# Altium footprint library SMT.PcbLib: 379 footprints (part 15 of 24)
Each footprint in its own frame and in the unit in brackets; x right, y up, seen from the top. Pads: shape width x height; smd on the part's side, far side on the other; paste and mask are expansions set on the pad; w line width, h text height; cw(c..) or ccw(c..) is an arc to the next point about the centre after c.
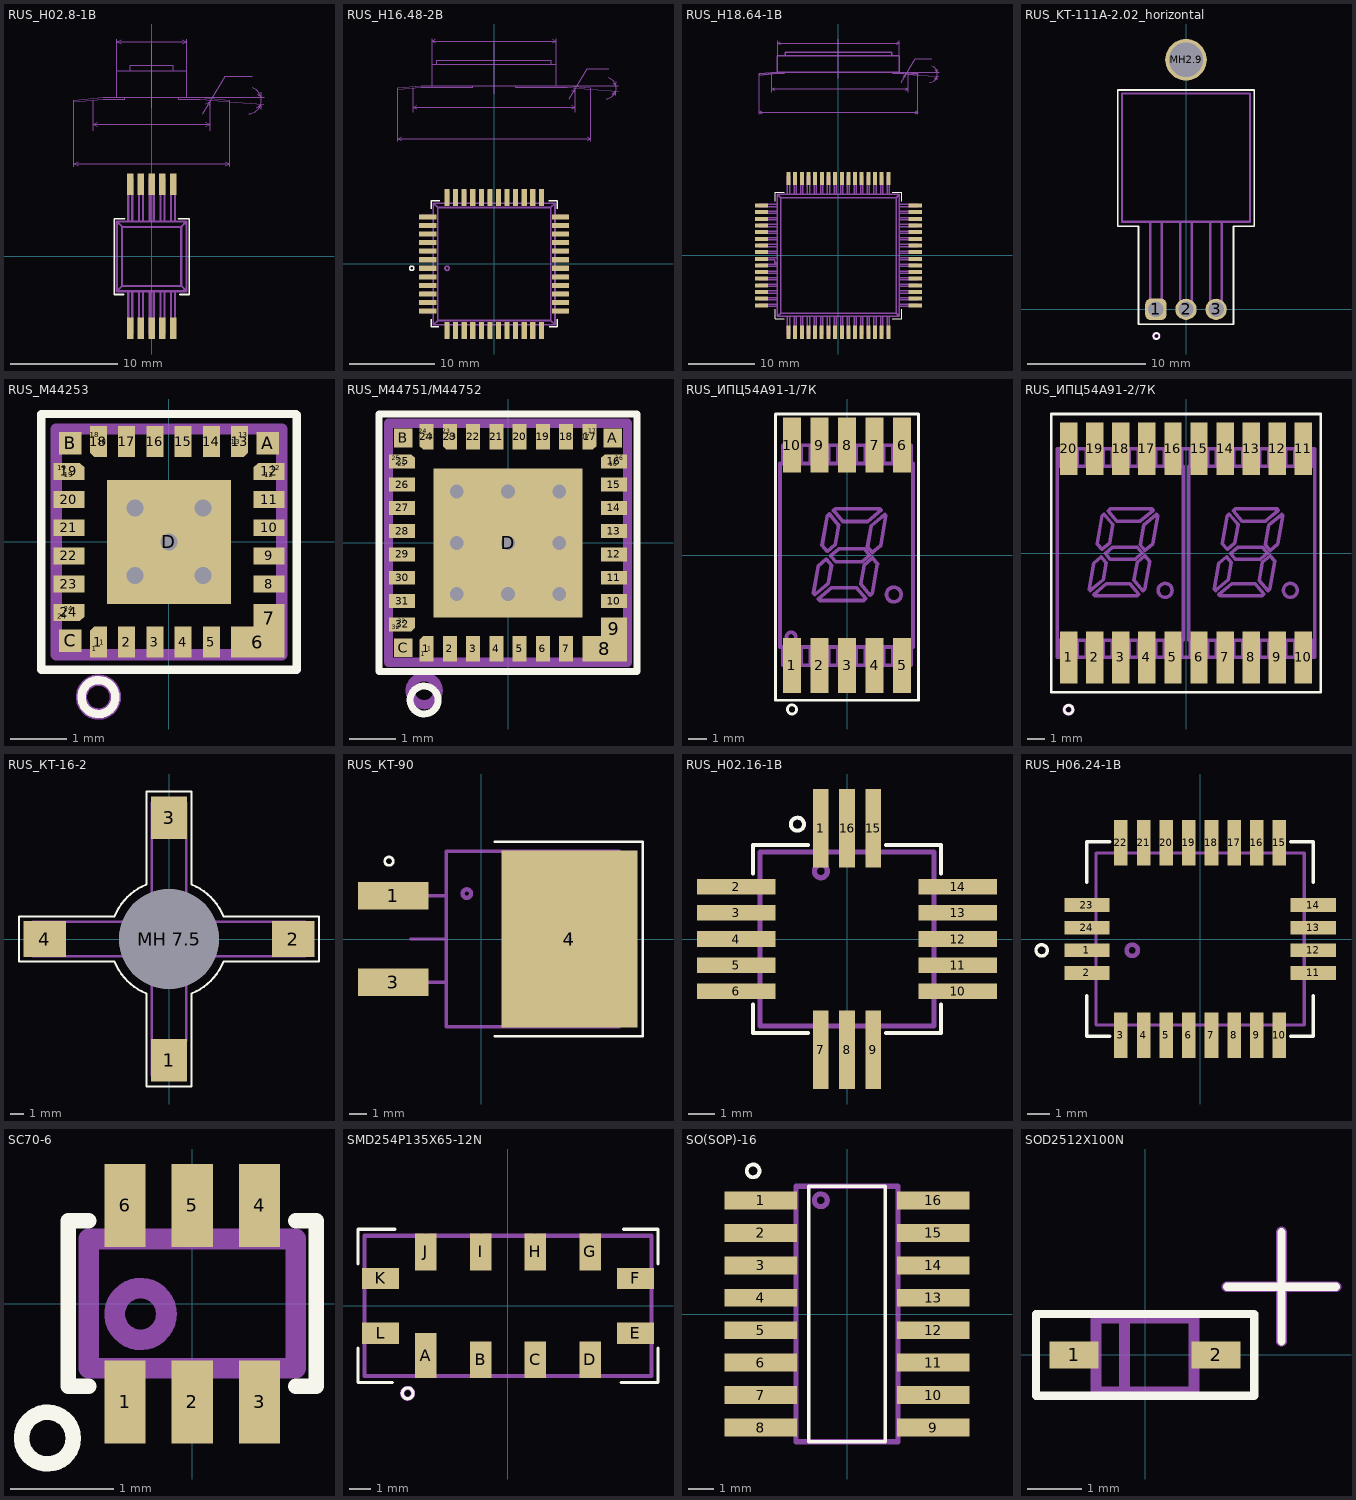
[diagram p14: the footprints below, top view; thin cyan lines are the x and y axes]

## RUS_H02.8-1B [mm] "Установка показана на слое Mech20"
height 2.9
pads (10):
  rect 0.6x2 smd: 1(-2,-6.7) 2(-1,-6.7) 3(1,-6.7) 4(2,-6.7) 5(2,6.7) 6(1,6.7) 7(-1,6.7) 8(-2,6.7) MH(0,-6.7) MH(0,6.7)
Top Overlay:
  lines w0.15: -2.6,-3.55 -3.5,-3.55 -3.5,3.5 -2.5,3.5 ; 2.5,3.5 3.5,3.5 3.5,-3.55 2.6,-3.55
Mechanical 1:
  lines w0.2: -2.185,-3.25 -2.185,-7.25 -1.815,-7.25 -1.815,-3.25 ; -2.185,3.25 -2.185,7.25 -1.815,7.25 -1.815,3.25 ; -1.185,-3.25 -1.185,-7.25 -0.815,-7.25 -0.815,-3.25 ; -1.185,3.25 -1.185,7.25 -0.815,7.25 -0.815,3.25 ; -0.185,-3.25 -0.185,-7.25 0.185,-7.25 0.185,-3.25 ; -0.185,3.25 -0.185,7.25 0.185,7.25 0.185,3.25 ; 0.815,-3.25 0.815,-7.25 1.185,-7.25 1.185,-3.25 ; 0.815,3.25 0.815,7.25 1.185,7.25 1.185,3.25 ; 1.815,-3.25 1.815,-7.25 2.185,-7.25 2.185,-3.25 ; 1.815,3.25 1.815,7.25 2.185,7.25 2.185,3.25 ; -3.25,-3.25 3.25,-3.25 ; -3.25,-3.25 -3.25,3.25 ; -3.25,-3.25 -2.75,-2.75 ; -3.25,3.25 -2.75,2.75 ; -3.25,3.25 3.25,3.25 ; -2.75,-2.75 -2.75,2.75 ; -2.75,-2.75 2.75,-2.75 ; -2.75,2.75 2.75,2.75 ; 2.75,-2.75 2.75,2.75 ; 2.75,-2.75 3.25,-3.25 ; 2.75,2.75 3.25,3.25 ; 3.25,-3.25 3.25,3.25
Mechanical 20:
  lines w0.1: -7.25,8.329 -7.25,14.389 ; -6.85,8.429 -7.25,8.629 ; -6.85,8.829 -7.25,8.629 ; -5.45,11.717 -5.45,14.546 ; -5.05,12.1 -5.45,12.3 ; -5.05,12.5 -5.45,12.3 ; -3.25,20.25 -3.25,17.3 ; -2.85,19.8 -3.25,20 ; -2.85,20.2 -3.25,20 ; -2.501,14.8 -2.501,14.629 -4.501,14.629 -7.25,14.389 ; 0,13.85 0,19.8 ; 2.501,14.8 2.501,14.629 4.501,14.629 7.25,14.389 ; 2.85,19.8 3.25,20 2.85,20.2 ; 3.2,20 -3.25,20 ; 3.25,20.25 3.25,17.3 ; 4.75,13.3 6.85,16.8 9.35,16.8 ; 5.05,12.1 5.45,12.3 ; 5.05,12.5 5.45,12.3 ; 5.05,14.2 5.45,14.467 5.4,14.025 ; 5.45,11.717 5.45,14.546 ; 6.85,8.429 7.25,8.629 ; 6.85,8.829 7.25,8.629 ; 7.25,8.329 7.25,14.389 ; 9.056,13.278 ccw(c8.975,14.525) 9.395,15.702 ; 9.8,13.825 10.2,14.192 10.2,13.7 ; 9.825,15.1 10.2,14.85 10.225,15.275 ; 10.45,14.175 7.25,14.389 ; 10.475,14.8 4.5,14.8 ; -7.25,8.629 7.25,8.629 ; -7.25,14.389 -7.25,14.559 -4.5,14.8 -3.25,14.8 ; -5.45,12.3 5.45,12.3 ; -3.25,14.8 3.25,14.8 ; -3.25,14.8 -3.25,17.3 ; -3.25,17.3 3.25,17.3 ; 3.25,14.8 3.25,17.3 ; 3.25,14.8 4.5,14.8 ; 4.5,14.8 7.25,14.559 7.25,14.389 ; -2,17.3 2,17.3 2,17.8 -2,17.8 -2,17.3
  text "6.5*" at -0.85,20.55 h1.2
  text "4-10" at 10.725,14.225 h1.2
  text "R0.3+0.1" at 6.325,17.375 h1.2
  text "14.5+-0.2" at -2.15,9.05 h1.2
  text "11,6+-0.1" at -2.3,12.8 h1.2
3D body "Н02.8-1В.stp": height 2.91, standoff 0.01, extent -3.25,-7.25 3.25,7.25

## RUS_H16.48-2B [mm] "Установка по РД 107.46000.019"
height 3
pads (48):
  rect 2x0.6 smd mask+0.05: 1(-7.75,-0.5) 2(-7.75,-1.5) 3(-7.75,-2.5) 4(-7.75,-3.5) 5(-7.75,-4.5) 6(-7.75,-5.5) 19(7.75,-5.5) 20(7.75,-4.5) 21(7.75,-3.5) 22(7.75,-2.5) 23(7.75,-1.5) 24(7.75,-0.5) 25(7.75,0.5) 26(7.75,1.5) 27(7.75,2.5) 28(7.75,3.5) 29(7.75,4.5) 30(7.75,5.5) 43(-7.75,5.5) 44(-7.75,4.5) 45(-7.75,3.5) 46(-7.75,2.5) 47(-7.75,1.5) 48(-7.75,0.5)
  rect 0.6x2 smd mask+0.05: 7(-5.5,-7.75) 8(-4.5,-7.75) 9(-3.5,-7.75) 10(-2.5,-7.75) 11(-1.5,-7.75) 12(-0.5,-7.75) 13(0.5,-7.75) 14(1.5,-7.75) 15(2.5,-7.75) 16(3.5,-7.75) 17(4.5,-7.75) 18(5.5,-7.75) 31(5.5,7.75) 32(4.5,7.75) 33(3.5,7.75) 34(2.5,7.75) 35(1.5,7.75) 36(0.5,7.75) 37(-0.5,7.75) 38(-1.5,7.75) 39(-2.5,7.75) 40(-3.5,7.75) 41(-4.5,7.75) 42(-5.5,7.75)
Top Overlay:
  circle w0.15: c-9.625,-0.5 r0.25
  lines w0.15: -7.35,-6.45 -7.35,-7.35 -6.45,-7.35 ; -7.35,6.45 -7.35,7.35 -6.35,7.35 ; 6.35,7.35 7.35,7.35 7.35,6.45 ; 6.45,-7.35 7.35,-7.35 7.35,-6.45
Mechanical 1:
  drawing of 161 lines, arcs and shapes, not listed
Mechanical 20:
  lines w0.1: -11.25,14.329 -11.25,20.389 ; -10.85,14.429 -11.25,14.629 ; -10.85,14.829 -11.25,14.629 ; -9.45,17.717 -9.45,20.546 ; -9.05,18.1 -9.45,18.3 ; -9.05,18.5 -9.45,18.3 ; -7.25,26.25 -7.25,23.3 ; -6.85,25.8 -7.25,26 ; -6.85,26.2 -7.25,26 ; -2.501,20.8 -2.501,20.629 -8.501,20.629 -11.25,20.389 ; -0.75,23.3 -7.25,23.3 ; 0,19.85 0,25.8 ; 0.75,23.3 7.25,23.3 ; 2.501,20.8 2.501,20.629 8.501,20.629 11.25,20.389 ; 6.85,25.8 7.25,26 ; 6.85,26.2 7.25,26 ; 7.25,26.25 7.25,23.3 ; 8.75,19.3 10.85,22.8 13.35,22.8 ; 9.05,18.1 9.45,18.3 ; 9.05,18.5 9.45,18.3 ; 9.05,20.2 9.45,20.467 9.4,20.025 ; 9.45,17.717 9.45,20.546 ; 10.85,14.429 11.25,14.629 ; 10.85,14.829 11.25,14.629 ; 11.25,14.329 11.25,20.389 ; 13.056,19.278 ccw(c12.975,20.525) 13.395,21.702 ; 13.8,19.825 14.2,20.192 14.2,19.7 ; 13.825,21.1 14.2,20.85 14.225,21.275 ; 14.45,20.175 11.25,20.389 ; 14.475,20.8 8.5,20.8 ; -11.25,14.629 11.25,14.629 ; -11.25,20.389 -11.25,20.559 -8.5,20.8 -7.25,20.8 ; -9.45,18.3 9.45,18.3 ; -7.25,20.8 -7.25,23.3 ; -7.25,20.8 7.25,20.8 ; -7.25,26 7.25,26 ; 7.25,20.8 8.5,20.8 ; 7.25,20.8 7.25,23.3 ; 8.5,20.8 11.25,20.559 11.25,20.389 ; -6.675,23.3 -6.675,23.8 6.675,23.8 6.675,23.3 -6.675,23.3
  text "16.2 max" at -2.3,18.8 h1.2
  text "22.5max" at -2.15,15.05 h1.2
  text "R0.3+0.1" at 10.325,23.375 h1.2
  text "4-10" at 14.725,20.225 h1.2
  text "14.2+0.3-0.215*" at -3.025,26.6 h1.2
  text "Установка по РД 107.46000.019" at -8.5,28.093 h1.5
3D body "H16_48-2B.stp": height 2.8, standoff 0, extent -8.5,-8.5 8.5,8.5

## RUS_H18.64-1B [mm] "Вариант установки на слое Mech20"
height 3
pads (64):
  rect 2x0.6 smd: 1(-11.55,-0.5) 2(-11.55,-1.5) 3(-11.55,-2.5) 4(-11.55,-3.5) 5(-11.55,-4.5) 6(-11.55,-5.5) 7(-11.55,-6.5) 8(-11.55,-7.5) 25(11.55,-7.5) 26(11.55,-6.5) 27(11.55,-5.5) 28(11.55,-4.5) 29(11.55,-3.5) 30(11.55,-2.5) 31(11.55,-1.5) 32(11.55,-0.5) 33(11.55,0.5) 34(11.55,1.5) 35(11.55,2.5) 36(11.55,3.5) 37(11.55,4.5) 38(11.55,5.5) 39(11.55,6.5) 40(11.55,7.5) 57(-11.55,7.5) 58(-11.55,6.5) 59(-11.55,5.5) 60(-11.55,4.5) 61(-11.55,3.5) 62(-11.55,2.5) 63(-11.55,1.5) 64(-11.55,0.5)
  rect 0.6x2 smd: 9(-7.5,-11.55) 10(-6.5,-11.55) 11(-5.5,-11.55) 12(-4.5,-11.55) 13(-3.5,-11.55) 14(-2.51,-11.55) 15(-1.5,-11.55) 16(-0.5,-11.55) 17(0.5,-11.55) 18(1.5,-11.55) 19(2.5,-11.55) 20(3.5,-11.55) 21(4.5,-11.55) 22(5.5,-11.55) 23(6.5,-11.55) 24(7.5,-11.55) 41(7.5,11.55) 42(6.5,11.55) 43(5.5,11.55) 44(4.5,11.55) 45(3.5,11.55) 46(2.5,11.55) 47(1.5,11.55) 48(0.5,11.55) 49(-0.5,11.55) 50(-1.5,11.55) 51(-2.5,11.55) 52(-3.5,11.55) 53(-4.5,11.55) 54(-5.5,11.55) 55(-6.5,11.55) 56(-7.5,11.55)
Top Overlay:
  lines w0.15: -9.5,-8.1 -9.5,-9.5 -8.1,-9.5 ; -9.5,8.1 -9.5,9.5 -8.1,9.5 ; 8.1,-9.5 9.5,-9.5 9.5,-8.1 ; 8.1,9.5 9.5,9.5 9.5,8.1
Mechanical 1:
  drawing of 206 lines, arcs and shapes, not listed
Mechanical 20:
  lines w0.1: -11.9,21.2 -11.9,27.259 ; -11.5,21.3 -11.9,21.5 ; -11.5,21.7 -11.9,21.5 ; -10,24.5 -10,27.329 ; -9.6,24.8 -10,25 ; -9.6,25.2 -10,25 ; -9.151,32.2 -9.15,30 ; -8.75,31.675 -9.15,31.875 ; -8.75,32.075 -9.15,31.875 ; 0,26.6 0,32.5 ; 8.725,31.675 9.125,31.875 ; 8.725,32.075 9.125,31.875 ; 9.15,27.5 15.125,27.5 ; 9.15,30 9.151,32.2 ; 9.4,26 11.5,29.5 14,29.5 ; 9.7,26.9 10.1,27.167 10.05,26.725 ; 10.1,24.8 10.5,25 ; 10.1,25.2 10.5,25 ; 10.5,24.5 10.5,27.211 ; 11.5,21.3 11.9,21.5 ; 11.5,21.7 11.9,21.5 ; 11.9,21.2 11.9,27.259 ; 11.9,27.089 15.1,26.875 ; 13.706,25.978 ccw(c13.625,27.225) 14.045,28.402 ; 14.45,26.525 14.85,26.892 14.85,26.4 ; 14.475,27.8 14.85,27.55 14.875,27.975 ; -11.9,21.5 11.9,21.5 ; -10,25 10.5,25 ; -9.15,31.875 9.125,31.875
  lines w0.2: -8.151,27.5 -8.151,27.329 -9.151,27.329 -11.9,27.089 -11.9,27.259 -9.15,27.5 ; 8.151,27.5 8.151,27.329 9.151,27.329 11.9,27.089 11.9,27.259 9.15,27.5 ; -9.15,27.5 9.15,27.5 ; -9.15,27.5 -9.15,30 9.15,30 9.15,27.5 ; -8,30 8,30 8,30.5 -8,30.5 -8,30
  text "4-10" at 15.375,26.925 h1.2
  text "R0.3+0.1" at 10.975,30.075 h1.2
  text "23.8+-0.2" at -2.3,21.8 h1.2
  text "21,9+-0.1" at -2.3,25.5 h1.2
  text "18.3*" at -1.25,32.8 h1.2
3D body "Н18.64-1В.stp": height 3.01, standoff 0.01, extent -11.9,-11.9 11.9,11.9

## RUS_KT-111A-2.02_horizontal [mm] "Установка по   ГОСТ 29137-91  вар.251.10.0402.40.00"
height 5.84
pads (4):
  rrect50% 1.8x1.8 hole 1.3 mask+0.05: 1(-2.54,0)
  round 1.8 hole 1.3 mask+0.05: 2(0,0) 3(2.54,0)
  round 3.5 hole 2.9 mask+0.05: MH2.9(0,21.05)
Top Overlay:
  circle w0.15: c-2.5,-2.25 r0.25
  lines w0.15: -5.75,7 -5.75,18.5 5.75,18.5 5.75,7 4,7 4,-1.25 -4,-1.25 -4,7 -5.75,7
Top Solder:
  rectangle: -5.35,7.4 5.4,18.15
Mechanical 1:
  circle w0.2: c-2.5,-2.25 r0.25
  lines w0.2: -3.025,7.4 -3.025,2 -3.025,-0.25 -2.055,-0.25 -2.055,2 -2.055,7.4 ; -0.485,7.4 -0.485,2 -0.485,-0.25 0.485,-0.25 0.485,2 0.485,7.4 ; 2.055,7.4 2.055,2 2.055,-0.25 3.025,-0.25 3.025,2 3.025,7.4 ; -5.4,7.4 -5.4,18.2 5.4,18.2 5.4,7.4 -5.4,7.4
Mechanical 20:
  text "Установка на теплоотвод и КПТ-8, / фоксировать прижимом ПБВК.745441.002 / Допускается крепить теплопроводящим клеем вместо прижима" at -8.2,22.95 h1.52
3D body "КТ-111А-2.02 ГОРИЗОНТАЛЬНО.stp": height 5.84, standoff -5.1, extent -5.4,-0.25 5.4,18.2

## RUS_M44253 [mm] "Модуль СВЧ переключатель 4х4mm"
height 1.26
pads (40):
  rect 0.17x0.31 smd paste+0 mask+0.04: 1(-1.315,-1.895) 13(1.315,1.895) 18(-1.315,1.895)
  oct 0.3x0.55 smd paste+0 mask+0.04: 1(-1.25,-1.775) 13(1.25,1.775) 18(-1.25,1.775)
  rect 0.17x0.55 smd paste+0 mask+0.04: 1(-1.185,-1.775) 13(1.185,1.775) 18(-1.185,1.775)
  rect 0.3x0.55 smd paste+0 mask+0.04: 2(-0.75,-1.775) 3(-0.25,-1.775) 4(0.25,-1.775) 5(0.75,-1.775) 14(0.75,1.775) 15(0.25,1.775) 16(-0.25,1.775) 17(-0.75,1.775)
  rect 0.95x0.55 smd paste+0 mask+0.04: 6(1.575,-1.775)
  rect 0.55x0.5 smd paste+0 mask+0.04: 7(1.775,-1.35)
  rect 0.55x0.3 smd paste+0 mask+0.04: 8(1.775,-0.75) 9(1.775,-0.25) 10(1.775,0.25) 11(1.775,0.75) 20(-1.775,0.75) 21(-1.775,0.25) 22(-1.775,-0.25) 23(-1.775,-0.75)
  oct 0.55x0.3 smd paste+0 mask+0.04: 12(1.775,1.25) 19(-1.775,1.25) 24(-1.775,-1.25)
  rect 0.55x0.17 smd paste+0 mask+0.04: 12(1.775,1.185) 19(-1.775,1.185) 24(-1.775,-1.185)
  rect 0.31x0.17 smd paste+0 mask+0.04: 12(1.895,1.315) 19(-1.895,1.315) 24(-1.895,-1.315)
  rect 0.4x0.4 smd paste+0 mask+0.04: A(1.75,1.75) B(-1.75,1.75) C(-1.75,-1.75)
  rect 2.2x2.2 all layers, no hole paste-5 mask+0.05: D(0,0)
via 0.6,-0.6 diameter 0.7 hole 0.3
via -0.6,-0.6 diameter 0.7 hole 0.3
via 0.6,0.6 diameter 0.7 hole 0.3
via -0.6,0.6 diameter 0.7 hole 0.3
via 0,0 diameter 0.7 hole 0.3
Top Overlay:
  circle w0.15: c-1.25,-2.75 r0.3
  lines w0.15: -2.265,2.25 -2.265,-2.265 2.25,-2.265 ; -2.265,2.265 2.25,2.265 ; 2.265,-2.265 2.265,2.25
Top Paste:
  region: -1,-1 -0.1,-1 -0.1,-0.1 -1,-0.1
  region: 1,-1 0.1,-1 0.1,-0.1 1,-0.1
  region: 1,1 0.1,1 0.1,0.1 1,0.1
  region: -1,1 -0.1,1 -0.1,0.1 -1,0.1
Mechanical 1:
  circle w0.2: c-1.25,-2.75 r0.3
  lines w0.2: -2,-2 -2,2 2,2 2,-2 -0.615,-2 -2,-2
3D body "Переключатель_ М44253.stp": height 1.26, standoff -0.01, extent -2,-2 2,2

## RUS_M44751/М44752 [mm] "Модуль СВЧ Аттенюатор"
height 1.26
pads (50):
  rect 0.17x0.31 smd paste+0 mask+0.04: 1(-1.815,-2.395) 17(1.815,2.395) 23(-1.315,2.395) 24(-1.815,2.395)
  oct 0.3x0.55 smd paste+0 mask+0.04: 1(-1.75,-2.275) 17(1.75,2.275) 23(-1.25,2.275) 24(-1.75,2.275)
  rect 0.17x0.55 smd paste+0 mask+0.04: 1(-1.685,-2.275) 17(1.685,2.275) 23(-1.185,2.275) 24(-1.685,2.275)
  rect 0.3x0.55 smd paste+0 mask+0.04: 2(-1.25,-2.275) 3(-0.75,-2.275) 4(-0.25,-2.275) 5(0.25,-2.275) 6(0.75,-2.275) 7(1.25,-2.275) 18(1.25,2.275) 19(0.75,2.275) 20(0.25,2.275) 21(-0.25,2.275) 22(-0.75,2.275)
  rect 0.95x0.55 smd paste+0 mask+0.04: 8(2.075,-2.275)
  rect 0.55x0.5 smd paste+0 mask+0.04: 9(2.275,-1.85)
  rect 0.55x0.3 smd paste+0 mask+0.04: 10(2.275,-1.25) 11(2.275,-0.75) 12(2.275,-0.25) 13(2.275,0.25) 14(2.275,0.75) 15(2.275,1.25) 26(-2.275,1.25) 27(-2.275,0.75) 28(-2.275,0.25) 29(-2.275,-0.25) 30(-2.275,-0.75) 31(-2.275,-1.25)
  oct 0.55x0.3 smd paste+0 mask+0.04: 16(2.275,1.75) 25(-2.275,1.75) 32(-2.275,-1.75)
  rect 0.55x0.17 smd paste+0 mask+0.04: 16(2.275,1.685) 25(-2.275,1.685) 32(-2.275,-1.685)
  rect 0.31x0.17 smd paste+0 mask+0.04: 16(2.395,1.815) 25(-2.395,1.815) 32(-2.395,-1.815)
  rect 0.4x0.4 smd paste+0 mask+0.04: A(2.25,2.25) B(-2.25,2.25) C(-2.25,-2.25)
  rect 3.2x3.2 all layers, no hole paste-5 mask+0.05: D(0,0)
via -1.1,-1.1 diameter 0.7 hole 0.3
via 0,-1.1 diameter 0.7 hole 0.3
via 1.1,-1.1 diameter 0.7 hole 0.3
via -1.1,0 diameter 0.7 hole 0.3
via 0,0 diameter 0.7 hole 0.3
via 1.1,0 diameter 0.7 hole 0.3
via -1.1,1.1 diameter 0.7 hole 0.3
via 0,1.1 diameter 0.7 hole 0.3
via 1.1,1.1 diameter 0.7 hole 0.3
Top Overlay:
  circle w0.15: c-1.8,-3.375 r0.3
  lines w0.15: -2.765,-2.765 -2.765,2.765 2.765,2.765 2.765,-2.765 -2.765,-2.765
Top Paste:
  region: -1.5,1.5 -0.15,1.5 -0.15,0.15 -1.5,0.15
  region: 1.5,-1.5 0.15,-1.5 0.15,-0.15 1.5,-0.15
  region: -1.5,-1.5 -0.15,-1.5 -0.15,-0.15 -1.5,-0.15
  region: 1.5,1.5 0.15,1.5 0.15,0.15 1.5,0.15
Mechanical 1:
  circle w0.2: c-1.8,-3.175 r0.3
  lines w0.2: -2.565,-2.565 2.565,-2.565 2.565,2.565 -2.565,2.565 -2.565,-2.565
3D body "Аттенюатор _ М44751.stp": height 1.26, standoff -0.01, extent -2.5,-2.5 2.5,2.5

## RUS_ИПЦ54А91-1/7К [mm] "SMD 7-segment display pitch 1.5 mm"
height 3.75
pads (10):
  rect 1x3 smd paste-0.1 mask+0.05: 1(-3,-6) 2(-1.5,-6) 3(0,-6) 4(1.5,-6) 5(3,-6) 6(3,6) 7(1.5,6) 8(0,6) 9(-1.5,6) 10(-3,6)
Top Overlay:
  circle w0.15: c-3,-8.4 r0.25
  lines w0.15: -3.9,-7.9 -3.9,7.7 3.9,7.7 3.9,-7.9 -3.9,-7.9
Mechanical 1:
  circle w0.2: c-3.048,-4.445 r0.25
  circle w0.2: c2.55,-2.14 r0.4
  lines w0.2: -3.5,-5 -3.5,-6 -3.3,-6 cw(c-3,-6) -2.7,-6 -2.5,-6 ; -3.5,5 -3.5,6 -3.3,6 ccw(c-3,6) -2.7,6 -2.5,6 ; -2.5,-5 -2.5,-6 ; -2.5,5 -2.5,6 ; -2,-5 -2,-6 ; -2,5 -2,6 ; -1,-5 -1,-6 ; -1,5 -1,6 ; -0.5,-5 -0.5,-6 ; -0.5,5 -0.5,6 ; 0.5,-5 0.5,-6 ; 0.5,5 0.5,6 ; 1,-5 1,-6 ; 1,5 1,6 ; 2,-5 2,-6 ; 2,5 2,6 ; 2.5,-5 2.5,-6 ; 2.5,5 2.5,6 ; 3.5,-5 3.5,-6 3.3,-6 ccw(c3,-6) 2.7,-6 2.5,-6 ; 3.5,5 3.5,6 3.3,6 cw(c3,6) 2.7,6 2.5,6 ; -2.5,-6 -2,-6 ; -2.5,6 -2,6 ; -2,-6 -1.8,-6 cw(c-1.5,-6) -1.2,-6 -1,-6 ; -2,6 -1.8,6 ccw(c-1.5,6) -1.2,6 -1,6 ; -1,-6 -0.5,-6 ; -1,6 -0.5,6 ; -0.5,-6 -0.3,-6 cw(c0,-6) 0.3,-6 0.5,-6 ; -0.5,6 -0.3,6 ccw(c0,6) 0.3,6 0.5,6 ; 0.5,-6 1,-6 ; 0.5,6 1,6 ; 1,-6 1.2,-6 cw(c1.5,-6) 1.8,-6 2,-6 ; 1,6 1.2,6 ccw(c1.5,6) 1.8,6 2,6 ; 2,-6 2.5,-6 ; 2,6 2.5,6 ; -3.65,-5 3.6,-5 3.6,5 -3.65,5 -3.65,-5 ; -1.823,-2.067 -1.561,-0.58 -1.122,-0.211 -0.843,-0.543 -1.018,-1.533 -1.753,-2.15 -1.823,-2.067 ; -1.56,-2.38 -1.491,-2.463 0.912,-2.463 1.029,-2.365 0.524,-1.763 -0.825,-1.763 -1.56,-2.38 ; -1.363,0.543 -1.079,2.151 -0.962,2.249 -0.457,1.647 -0.645,0.58 -1.085,0.211 -1.363,0.543 ; -0.892,-0.018 -0.614,-0.35 0.819,-0.35 1.236,0 0.942,0.35 -0.453,0.35 -0.892,-0.018 ; -0.732,2.442 -0.227,1.84 1.122,1.84 1.857,2.457 1.787,2.54 -0.615,2.54 -0.732,2.442 ; 0.754,-1.57 1.259,-2.172 1.376,-2.074 1.658,-0.474 1.386,-0.15 0.938,-0.526 0.754,-1.57 ; 1.114,0.474 1.386,0.15 1.834,0.526 2.12,2.144 2.05,2.227 1.315,1.61 1.114,0.474
3D body "ИПЦ54А91-1_7К.stp": height 3.05, standoff -0.01, extent -3.65,-6 3.65,6

## RUS_ИПЦ54А91-2/7К [mm] "SMD 7-segment display pitch 1.5 mm"
height 3.75
pads (20):
  rect 1x3 smd paste-0.1 mask+0.05: 1(-6.75,-6) 2(-5.25,-6) 3(-3.75,-6) 4(-2.25,-6) 5(-0.75,-6) 6(0.75,-6) 7(2.25,-6) 8(3.75,-6) 9(5.25,-6) 10(6.75,-6) 11(6.75,6) 12(5.25,6) 13(3.75,6) 14(2.25,6) 15(0.75,6) 16(-0.75,6) 17(-2.25,6) 18(-3.75,6) 19(-5.25,6) 20(-6.75,6)
Top Overlay:
  circle w0.15: c-6.75,-9 r0.25
  lines w0.15: -7.75,-8 7.75,-8 7.75,8 -7.75,8 -7.75,-8
Mechanical 1:
  drawing of 221 lines, arcs and shapes, not listed
3D body "ИПЦ54А91-2_7К.stp": height 3.05, standoff -0.01, extent -7.4,-6 7.4,6

## RUS_КТ-16-2 [mm] "n-p-n свч транзистор, корпус КТ-16-2, общая высота 15.8мм"
height 15
pads (5):
  rect 2.7x3.2 smd paste-10: 1(0,-9.15) 3(0,9.15)
  rect 3.2x2.7 smd paste-10: 2(9.35,0) 4(-9.35,0)
  round 7.5 hole 7.5 unplated: "MH 7.5"(0,0)
Top Overlay:
  lines w0.15: -11.3,-1.7 -11.3,1.7 -4.1,1.7 cw(c-0.15,0.15) -1.7,4.1 -1.7,11.1 1.7,11.1 1.7,4.1 cw(c0.15,0.15) 4.1,1.7 11.3,1.7 11.3,-1.7 4.1,-1.7 cw(c0.15,-0.15) 1.7,-4.1 1.7,-11.1 -1.7,-11.1 -1.7,-4.1 cw(c-0.15,-0.15) -4.1,-1.7 -11.3,-1.7
Mechanical 1:
  circle w0.2: c0,0 r3.6
  lines w0.2: -3.4,-1.3 -10.25,-1.3 -10.25,1.3 -3.4,1.3 ; -1.3,-3.4 -1.3,-10.25 1.3,-7.65 1.3,-3.4 ; -1.3,3.4 -1.3,10.25 1.3,10.25 1.3,3.4 ; 3.4,-1.3 10.25,-1.3 10.25,1.3 3.4,1.3
Mechanical 20:
  text "Требуется отвести тепло" at -9.03,12.83 h1.8
3D body "Транзистор 2Т939 (установка без формовки).stp": height 14.8, standoff -1, extent -10.25,-10.25 10.25,10.25

## RUS_КТ-90 [mm] "D2-PAK, 3-Pads, Body 7,77x8,51mm (max), IPC Medium Density"
height 4.6
pads (3):
  rect 4.15x1.6 smd paste-0.1: 1(-5.175,2.54) 3(-5.175,-2.54)
  rect 8x10.4 hole 0.3: 4(5.175,0)
Top Overlay:
  circle w0.15: c-5.43,4.572 r0.25
  lines w0.15: 0.775,-5.715 9.485,-5.715 9.485,5.715 0.775,5.715
Top Paste:
  rectangle: 1.872,0.586 4.622,3.336
  region: 8.372,3.336 5.622,3.336 5.622,0.586 8.372,0.586
  region: 8.372,-0.414 5.622,-0.414 5.622,-3.164 8.372,-3.164
  rectangle: 1.872,-3.164 4.622,-0.414
Mechanical 1:
  circle w0.25: c-0.858,2.667 r0.25
  lines w0.2: -5.175,-2.54 -2.075,-2.54 ; -5.175,2.54 -2.075,2.54 ; -4.16,0 -2.075,0 ; 7.275,-5 7.275,5.15 ; 7.275,-5.15 -2.075,-5.15 -2.075,5.15 7.275,5.15 ; 7.275,-5.15 7.275,5.15 ; 7.275,-5.15 8.1,-5.15 8.775,-4.475 8.775,4.475 8.1,5.15 7.275,5.15
Mechanical 20:
  text "Необходима прошивка, см. pdf" at -2.075,5.75 h1.3
3D body "DPAK254P1505X460-3N.step": height 4.8, standoff 0, extent -5.565,-5.15 9.485,5.15

## RUS_Н02.16-1В [mm] "16-ти выводной металлокерамический корпус Н02.16-1В"
height 3
pads (16):
  rect 0.6x3 smd mask+0.05: 1(-1,4.25) 7(-1,-4.25) 8(0,-4.25) 9(1,-4.25) 15(1,4.25) 16(0,4.25)
  rect 3x0.6 smd mask+0.05: 2(-4.25,2) 3(-4.25,1) 4(-4.25,0) 5(-4.25,-1) 6(-4.25,-2) 10(4.25,-2) 11(4.25,-1) 12(4.25,0) 13(4.25,1) 14(4.25,2)
Top Overlay:
  circle w0.15: c-1.9,4.4 r0.25
  lines w0.15: -3.6,-2.5 -3.6,-3.6 -1.5,-3.6 ; -3.6,2.5 -3.6,3.6 -1.5,3.6 ; 1.5,-3.6 3.6,-3.6 3.6,-2.5 ; 1.5,3.6 3.6,3.6 3.6,2.5
Mechanical 1:
  circle w0.2: c-1,2.6 r0.25
  lines w0.2: -3.34,-3.34 -3.34,3.34 3.34,3.34 3.34,-3.34 -3.34,-3.34
3D body "Корпус Н02.16-1В.stp": height 3.01, standoff 0.01, extent -5.25,-5.25 5.25,5.25

## RUS_Н06.24-1В [mm] "Установка по РД107.460000.019-90 вар.V"
height 3
pads (24):
  rect 2x0.6 smd mask+0.05: 1(-5,-0.5) 2(-5,-1.5) 11(5,-1.5) 12(5,-0.5) 13(5,0.5) 14(5,1.5) 23(-5,1.5) 24(-5,0.5)
  rect 0.6x2 smd mask+0.05: 3(-3.5,-4.25) 4(-2.5,-4.25) 5(-1.5,-4.25) 6(-0.5,-4.25) 7(0.5,-4.25) 8(1.5,-4.25) 9(2.5,-4.25) 10(3.5,-4.25) 15(3.5,4.25) 16(2.5,4.25) 17(1.5,4.25) 18(0.5,4.25) 19(-0.5,4.25) 20(-1.5,4.25) 21(-2.5,4.25) 22(-3.5,4.25)
Top Overlay:
  circle w0.15: c-7,-0.5 r0.25
  lines w0.15: -5,-2.5 -5,-4.1 -5,-4.3 -4,-4.3 ; -5,2.5 -5,4.1 -5,4.3 -4,4.3 ; 4,-4.3 5,-4.3 5,-4.1 5,-2.5 ; 4,4.3 5,4.3 5,4.1 5,2.5
Mechanical 1:
  circle w0.2: c-3,-0.5 r0.25
  lines w0.15: -4.6,-3.8 4.6,-3.8 4.6,3.8 -4.6,3.8 -4.6,-3.8
3D body "H06.stp": height 2.8, standoff -0.2, extent -5.75,-5 5.75,5

## SC70-6 [mm] "6-Lead Plastic SC70"
height 1
pads (6):
  rect 0.4x0.8 smd mask+0.05: 1(-0.65,-0.95) 2(0,-0.95) 3(0.65,-0.95) 4(0.65,0.95) 5(0,0.95) 6(-0.65,0.95)
Top Overlay:
  circle w0.15: c-1.4,-1.3 r0.25
  lines w0.15: -1,-0.8 -1.2,-0.8 -1.2,0.8 -1,0.8 ; 1,-0.8 1.2,-0.8 1.2,0.8 1,0.8
Mechanical 1:
  circle w0.2: c-0.5,-0.1 r0.25
  lines w0.2: -0.65,-1.2 -0.65,-0.625 ; -0.65,0.625 -0.65,1.2 ; 0,-1.2 0,-0.625 ; 0,0.625 0,1.2 ; 0.65,-1.2 0.65,-0.625 ; 0.65,0.625 0.65,1.2 ; -1,-0.625 1,-0.625 1,0.625 -1,0.625 -1,-0.625
3D body "SC70-6.stp": height 0.95, standoff 0, extent -1,-1.05 1,1.05

## SMD254P135X65-12N [mm] "SMD Body:13,3х6,5mm; Pich2,54mm; 12-leads"
height 1.65
pads (12):
  rect 0.99x2.1 smd: A(-3.81,-2.3)
  rect 0.99x1.7 smd: B(-1.27,-2.5) C(1.27,-2.5) D(3.81,-2.5) G(3.81,2.5) H(1.27,2.5) I(-1.27,2.5) J(-3.81,2.5)
  rect 1.7x0.99 smd: E(5.905,-1.27) F(5.905,1.27) K(-5.905,1.27) L(-5.905,-1.27)
Top Overlay:
  circle w0.15: c-4.65,-4.05 r0.25
  lines w0.15: -6.95,-1.95 -6.95,-3.55 -5.35,-3.55 ; -6.95,1.95 -6.95,3.55 -5.25,3.55 ; 5.25,-3.55 6.95,-3.55 6.95,-1.95 ; 5.35,3.55 6.95,3.55 6.95,1.95
Mechanical 1:
  circle w0.2: c-4.65,-4.05 r0.25
  lines w0.2: -6.65,-3.25 -6.65,-1.37 ccw(c-6.65,-1.27) -6.65,-1.17 -6.65,1.17 ccw(c-6.65,1.27) -6.65,1.37 -6.65,3.25 -3.91,3.25 ccw(c-3.81,3.25) -3.71,3.25 -1.37,3.25 ccw(c-1.27,3.25) -1.17,3.25 1.17,3.25 ccw(c1.27,3.25) 1.37,3.25 3.71,3.25 ccw(c3.81,3.25) 3.91,3.25 6.65,3.25 6.65,1.37 ccw(c6.65,1.27) 6.65,1.17 6.65,-1.17 ccw(c6.65,-1.27) 6.65,-1.37 6.65,-3.25 3.91,-3.25 ccw(c3.81,-3.25) 3.71,-3.25 1.37,-3.25 ccw(c1.27,-3.25) 1.17,-3.25 -1.17,-3.25 ccw(c-1.27,-3.25) -1.37,-3.25 -3.71,-3.25 ccw(c-3.81,-3.25) -3.91,-3.25 -6.65,-3.25
3D body "Фильтр TB0770A.stp": height 1.65, standoff 0, extent -6.65,-3.25 6.65,3.25

## SO(SOP)-16 [mm] "SO(SOP), 16-Leads, Body 10,0x4mm, Pitch 1,27mm, IPC Large Density"
height 1.75
pads (16):
  rect 2.85x0.701 smd: 1(-3.375,4.445) 2(-3.375,3.175) 3(-3.375,1.905) 4(-3.375,0.635) 5(-3.375,-0.635) 6(-3.375,-1.905) 7(-3.375,-3.175) 8(-3.375,-4.445) 9(3.375,-4.445) 10(3.375,-3.175) 11(3.375,-1.905) 12(3.375,-0.635) 13(3.375,0.635) 14(3.375,1.905) 15(3.375,3.175) 16(3.375,4.445)
Top Overlay:
  circle w0.15: c-3.675,5.6 r0.25
  lines w0.15: -1.5,-5 1.5,-5 1.5,5 -1.5,5 -1.5,-5
Mechanical 1:
  circle w0.2: c-1.025,4.45 r0.25
  lines w0.2: -2,-5 -2,5 2,5 2,-5 -2,-5
Mechanical 20:
  text "DON'T USE" at -6.396,-7.946 h1.52
3D body "SO16N.STEP": height 1.54, standoff 0.02, extent -3,-4.95 3,4.95

## SOD2512X100N [mm] "SOD Diode; 1.8mm W X 1.35mm L X 1.00mm H Body"
height 1.1
pads (2):
  rect 0.9x0.5 smd: 1(-1.3,0) 2(1.3,0)
Top Overlay:
  lines w0.15: 1.5,1.25 3.5,1.25 ; 2.5,0.25 2.5,2.25 ; -2,-0.75 2,-0.75 2,0.75 -2,0.75 -2,-0.75
Mechanical 1:
  lines w0.2: -1.35,0 -0.9,0 ; -0.375,-0.65 -0.375,0.675 ; 0.9,0 1.35,0 ; 1.5,1.25 3.5,1.25 ; 2.5,0.25 2.5,2.25 ; -0.9,-0.675 0.9,-0.675 0.9,0.675 -0.9,0.675 -0.9,-0.675
3D body "SOD323.STEP": height 0.96, standoff 0.01, extent -1.25,-0.625 1.25,0.625